# Altium footprint library PCBLIB.PcbLib: 775 footprints (part 43 of 49)
Each footprint in its own frame and in the unit in brackets; x right, y up, seen from the top. Pads: shape width x height; smd on the part's side, far side on the other; paste and mask are expansions set on the pad; w line width, h text height; cw(c..) or ccw(c..) is an arc to the next point about the centre after c.
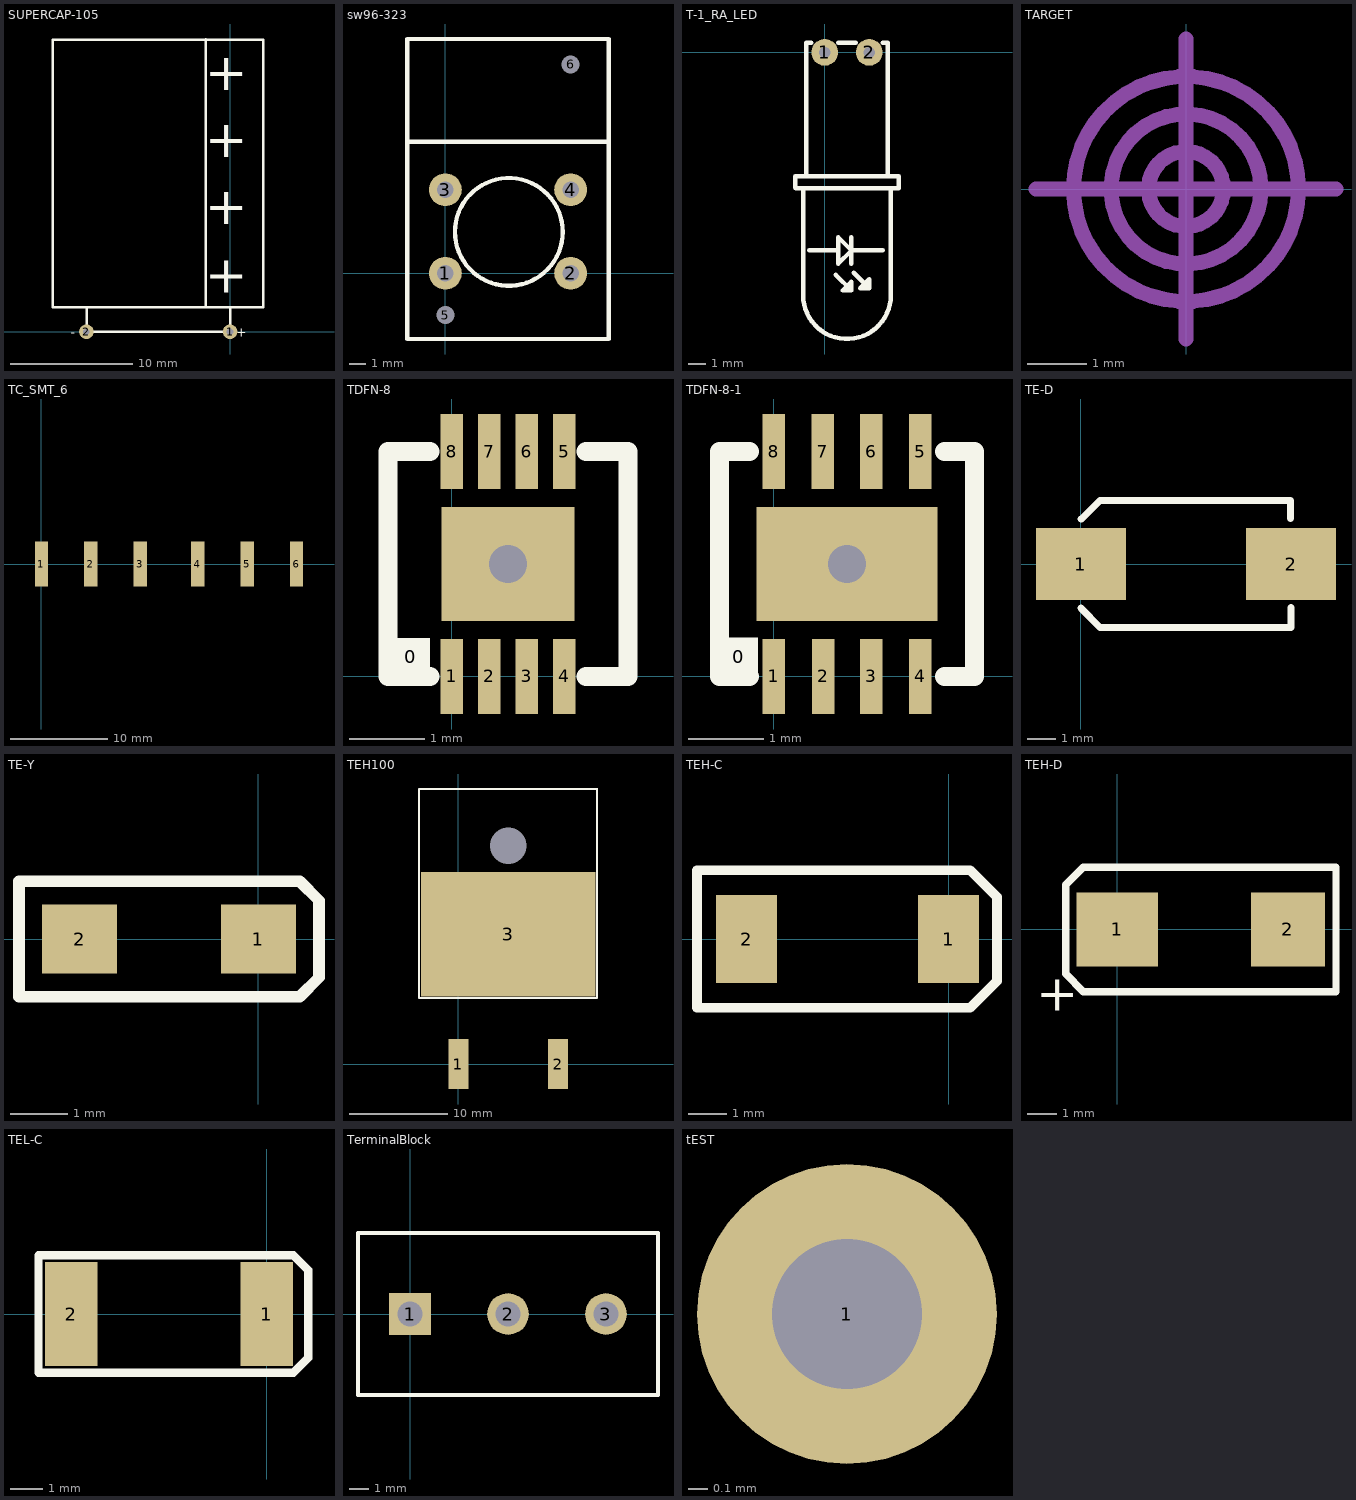
[diagram p42: the footprints below, top view; thin cyan lines are the x and y axes]

## SUPERCAP-105 [mm]
height 29
pads (2):
  round 1.2 hole 0.54: 1(0,0) 2(-11.8,0)
TopOverlay:
  lines w0.203: -11.8,0 0,0 0,2 ; -11.775,0 -11.775,2 ; -2.007,2.076 -2.007,24.054 ; -14.55,2 -14.55,24 2.75,24 2.75,2 -14.55,2
  text "-" at -12.7,-0.432 h0.76
  text "+" at 1.372,-0.406 h0.76
  text "+" at 1.473,3.2 h3.05
  text "+" at 1.473,8.814 h3.05
  text "+" at 1.473,14.326 h3.05
  text "+" at 1.473,19.837 h3.05

## sw96-323 [mm]
pads (6):
  round 2 hole 1: 1(0,0) 2(7.62,0) 3(0,5.08) 4(7.62,5.08)
  round 1 hole 1.1 unplated: 5(0,-2.54) 6(7.62,12.7)
TopOverlay:
  circle w0.254: c3.861,2.515 r3.277
  lines w0.254: -2.315,8 9.935,8 ; -2.315,-4 -2.315,14.25 9.935,14.25 9.935,-4 -2.315,-4

## T0220Horz_HS [mil]

## T-1_RA_LED [mil]
height 300
pads (2):
  round 60 hole 25: 1(0,0) 2(100,0)
TopOverlay:
  lines w10: -41.5,-278 -41.5,22 -30,22 ; -35,-445 30,-445 ; 25,-500 60,-535 ; 30,22 70,22 ; 60,-475 60,-445 ; 60,-415 60,-445 ; 65,-495 100,-530 ; 130,-445 85,-445 60,-445 ; 130,22 141.5,22 141.5,-278 ; 148.5,-305 148.5,-545.5 cw(c50,-545.5) -48.5,-545.5 -48.5,-305 ; -48.5,-305 166,-305 166,-278 -66,-278 -66,-304 -65,-305 -48.5,-305 ; 30,-445 30,-415 60,-445 ; 30,-445 30,-475 60,-445 ; 60,-535 60,-515 40,-535 60,-535 ; 100,-530 100,-510 80,-530 100,-530

## TARGET [mil]
Mechanical2:
  circle w10: c0,0 r75
  circle w10: c0,0 r50
  circle w10: c0,0 r25
  lines w10: -100,0 100,0 ; 0,-100 0,100

## TC_SMT_6 [mil]
pads (6):
  rect 54x182 smd: 1(0,0) 2(200,0) 3(400,0) 4(632,0) 5(832,0) 6(1032,0)
TopOverlay:
  text "." at 1025.34,105 h80
  text "." at 825.34,105 h80
  text "." at 625.34,105 h80
  text "." at 393.34,105 h80
  text "." at 193.34,105 h80
  text "." at -6.66,105 h80

## TDFN-8 [mm]
height 0.8
pads (10):
  rect 0.508x0.508 on Top Overlay: 0(-0.546,0.263)
  rect 0.3x1 smd: 1(0,0) 2(0.5,0) 3(1,0) 4(1.5,0) 5(1.5,3) 6(1,3) 7(0.5,3) 8(0,3)
  rect 1.778x1.524 / inner round 0.508 / far side round 0.508 hole 0.508: ""(0.75,1.5)
TopOverlay:
  lines w0.254: -0.29,0 -0.85,0 -0.85,3 -0.29,3 ; 1.79,0 2.35,0 2.35,3 1.79,3

## TDFN-8-1 [mm]
height 0.8
pads (10):
  rect 0.508x0.508 on Top Overlay: 0(-0.468,0.267)
  rect 0.3x1 smd: 1(0,0) 2(0.655,0) 3(1.3,0) 4(1.95,0) 5(1.95,3) 6(1.3,3) 7(0.65,3) 8(0,3)
  rect 2.413x1.524 / inner round 0.508 / far side round 0.508 hole 0.508: ""(0.975,1.5)
TopOverlay:
  lines w0.254: -0.325,0 -0.725,0 -0.725,3 -0.325,3 ; 2.275,0 2.675,0 2.675,3 2.275,3

## TE-D [mil]
pads (2):
  rect 126x101 smd: 1(0,0) 2(295,0)
TopOverlay:
  lines w10: 0,-62 27,-89 63,-89 232,-89 295,-89 295,-61 ; 0,63 1,63 27,89 63,89 232,89 294,89 294,64

## TE-Y [mm]
pads (2):
  rect 1.3x1.2 smd: 1(0,0) 2(-3.1,0)
TopOverlay:
  lines w0.2: -4.15,-1 0.717,-1 1.05,-0.667 1.05,0.667 0.717,1 -4.15,1 -4.15,0 -4.15,-1
Mechanical4:
  text ".250" at -1.55,0 h0.03

## TEH100 [mil]
height 825
pads (4):
  rect 80x200 smd: 1(0,0) 2(400,0)
  rect 700x500 smd: 3(200,520)
  round 10 hole 147 unplated: MH(200,875)
TopOverlay:
  lines w8: -158.03,263.88 -158.03,1102.33 555.68,1102.33 555.97,1102.05 555.97,263.88 -158.03,263.88

## TEH-C [mm]
pads (2):
  rect 1.6x2.3 smd: 1(0,0) 2(-5.3,0)
TopOverlay:
  lines w0.254: -6.6,-1.8 0.034,-1.8 0.57,-1.8 1.27,-1.1 1.27,1.1 0.57,1.8 -0.855,1.8 -6.6,1.8 -6.6,-1.8
Mechanical4:
  text ".106" at 0,0 h0.03
  text ".110" at -5.3,0 h0.03

## TEH-D [mil]
height 130
pads (2):
  rect 110x100 smd: 1(0,0)
  rect 100x100 smd: 2(230,0)
TopOverlay:
  lines w10: -31,84 -46,84 ; -27,-84 -46,-84 ; -46,-84 -70,-60 -70,0 -70,60 -46,84 ; -46,-84 295,-84 295,84 -46,84
  text "+" at -110,-110 h50
Mechanical4:
  text ".118" at 0,0 h1

## TEL-C [mm]
height 2.489
pads (2):
  rect 1.6x3.2 smd: 1(0,0) 2(-6,0)
TopOverlay:
  lines w0.254: -7,-1.8 -7,1.8 -0.855,1.8 0.57,1.8 0.816,1.8 1.27,1.346 1.27,-1.346 0.816,-1.8 0.57,-1.8 0.034,-1.8 -7,-1.8
Mechanical4:
  text ".110" at -5.3,0 h0.03
  text ".106" at 0,0 h0.03

## TerminalBlock [mil]
height 0.5
pads (3):
  rect 85x85 hole 51.18: 1(0,0)
  round 85 hole 51.18: 2(200,0) 3(400,0)
TopOverlay:
  lines w7.99: -106.3,-165.35 506.3,-165.35 ; -106.3,165.35 506.3,165.35
  lines w8: -106.3,-165.35 -106.3,165.35 ; 506.3,-165.35 506.3,165.35

## tEST [mil]
pads (1):
  round 60 hole 30: 1(-120.91,-65.03)